# Altium footprint library iuh-thuc-hanh.PcbLib: 72 footprints (part 1 of 5)
Each footprint in its own frame and in the unit in brackets; x right, y up, seen from the top. Pads: shape width x height; smd on the part's side, far side on the other; paste and mask are expansions set on the pad; w line width, h text height; cw(c..) or ccw(c..) is an arc to the next point about the centre after c.
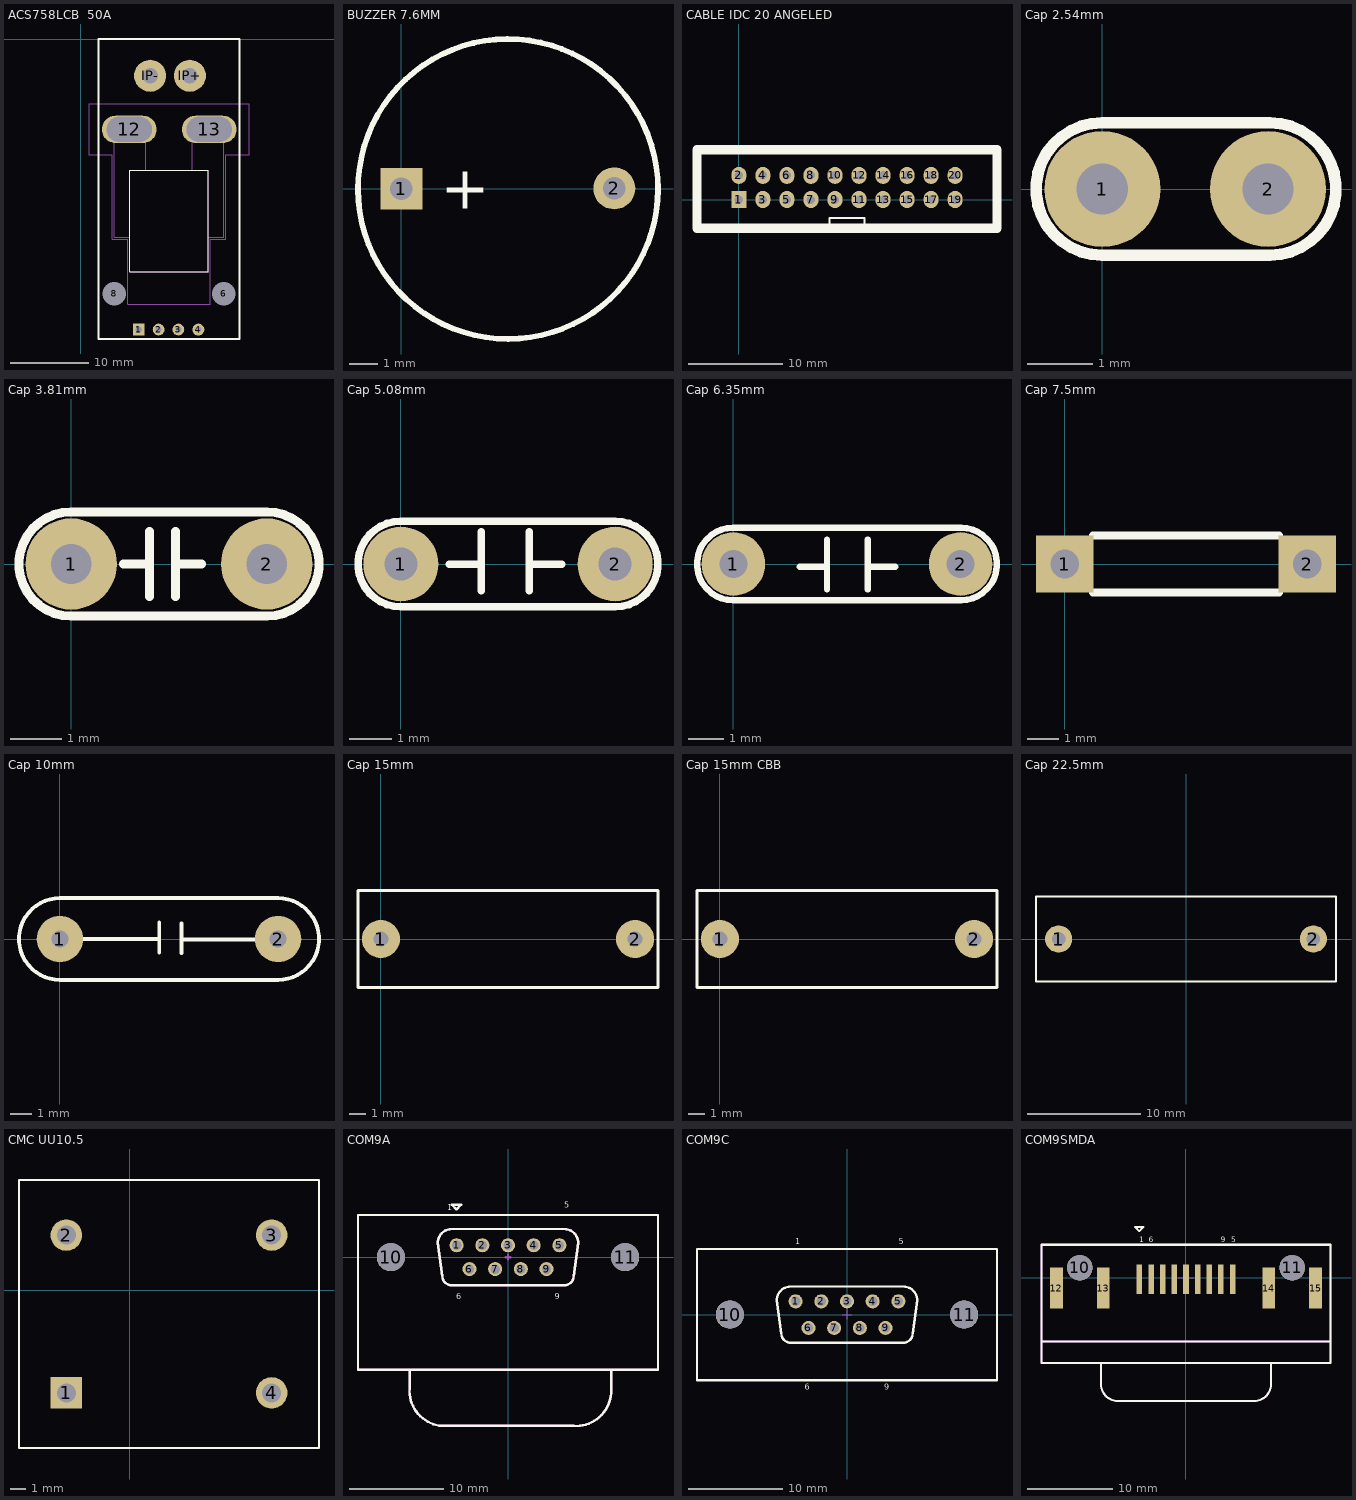
[diagram p0: the footprints below, top view; thin cyan lines are the x and y axes]

## ACS758LCB  50A [mm]
height 7.1
pads (10):
  rect 1.5x1.5 / inner round 1.5 / far side rect 1.5x1.5 hole 0.8: 1(7.434,-37.148)
  round 1.5 hole 0.8: 2(9.974,-37.148) 3(12.506,-37.148)
  round 1.524 hole 0.762: 4(15.054,-37.148)
  round 1.524 hole 3: 6(18.288,-32.575) 8(4.318,-32.575)
  oval 7x3.5 hole 3.2 slot 5.8 at 0 deg unplated: 12(6.223,-11.557) 13(16.447,-11.557)
  round 4.1 hole 2: IP+(13.97,-4.699) IP-(8.89,-4.699)
Top Overlay:
  circle w0.2: c10.219,-36.965 r0.1
  lines w0.127: 6.303,-29.775 16.303,-29.775 16.303,-16.775 6.303,-16.775 6.303,-29.775
  lines w0.254: 2.286,-38.354 2.286,0 20.32,0 20.32,-13.525 20.32,-38.354 2.286,-38.354
Mechanical 1:
  lines w0: 6.303,-10.525 6.353,-10.525 ; 16.303,-10.525 16.353,-10.525 ; 4.303,-12.525 cw(c4.303,-11.525) 4.303,-10.525 8.303,-10.525 cw(c8.303,-11.525) 8.303,-12.525 4.303,-12.525 ; 14.303,-12.525 cw(c14.303,-11.525) 14.303,-10.525 18.303,-10.525 cw(c18.303,-11.525) 18.303,-12.525 14.303,-12.525
Mechanical 13:
  circle w0.2: c10.219,-36.965 r0.1
  lines w0.127: 4.303,-10.775 4.303,-25.375 6.303,-25.375 ; 8.303,-16.725 8.303,-10.775 ; 14.303,-16.725 14.303,-10.775 18.303,-10.775 18.303,-25.375 16.303,-25.375 ; 6.303,-25.375 6.303,-16.775 16.303,-16.775 16.303,-29.775 6.303,-29.775 6.303,-25.375
Mechanical 15:
  lines w0.05: 1.053,-14.775 4.053,-14.775 4.053,-25.625 6.053,-25.625 6.053,-33.925 16.553,-33.925 16.553,-25.625 18.553,-25.625 18.553,-14.775 21.553,-14.775 21.553,-8.275 1.053,-8.275 ; 1.079,-14.755 1.079,-8.255
3D body "step_temp.STEP": height 7.1, standoff -3.5, extent 4.366,-33.361 18.367,-10.775
3D body: height -0.1, standoff -0.2, extent 2.27,-34.037 20.32,-8.234

## BUZZER 7.6MM [mm]
pads (2):
  rect 1.5x1.5 hole 0.8: 1(0,0)
  round 1.5 hole 0.8: 2(7.62,0.013)
Top Overlay:
  lines w0.203: 7.724,3.67 ccw(c3.816,-0.008) 7.76,3.632
  text "+" at 1.41,-0.711 h1.52
3D body "User Library-Buzzer WST-1203UX.step": height 4.5, standoff -9.65, extent -2.215,-6 13.239,6

## CABLE IDC 20 ANGELED [mm] "Connector; Header; 5x2 Position"
pads (20):
  rect 1.6x1.8 hole 0.9: 1(0,0)
  oval 1.6x1.8 hole 0.9: 2(0,2.54) 3(2.54,0) 4(2.54,2.54) 5(5.08,0) 6(5.08,2.54) 7(7.62,0) 8(7.62,2.54) 9(10.16,0) 10(10.16,2.54) 11(12.7,0) 12(12.7,2.54) 13(15.24,0) 14(15.24,2.54) 15(17.78,0) 16(17.78,2.54) 17(20.32,0) 18(20.32,2.54) 19(22.86,0) 20(22.86,2.54)
Top Overlay:
  lines w0.254: 9.576,-2.5 9.576,-1.956 11.43,-1.956 13.284,-1.956 13.284,-2.5
  lines w1: 8.28,-3.048 27.28,-3.048 27.28,5.27 8.28,5.27 ; 14.58,-3.048 -4.42,-3.048 -4.42,5.27 14.58,5.27
3D body "IDC 20P ANGELED MALE.stp": height 10.61, standoff -2.39, extent -5.08,-0.292 27.94,20.853

## Cap 2.54mm [mil]
height 200
pads (2):
  round 70 hole 31: 1(0,0) 2(100,0)
Top Overlay:
  lines w7: 100,-40 0,-40 cw(c0,0) 0,40 100,40 ; 101,-40 ccw(c101,0) 101,40
3D body "SW3dPS-Cap 100n.STEP": height 265, standoff -46.85, extent -59.93,-30 169.93,36.79

## Cap 3.81mm [mil]
height 200
pads (2):
  round 70 hole 31: 1(0,0) 2(150,0)
Top Overlay:
  lines w7: 40,0 60,0 ; 60,-25 60,25 ; 80,-25 80,25 ; 80,0 100,0 ; 0,-40 cw(c0,0) 0,40 150,40 cw(c150,0) 150,-40 0,-40
3D body "User Library-6mm radial ceramic disc capacitor.STEP": height 988.96, standoff -334.65, extent -41.22,-70 195,79.61

## Cap 5.08mm [mil]
height 200
pads (2):
  round 70 hole 31: 1(0,0) 2(200,0)
Top Overlay:
  lines w7: 45,0 75,0 ; 75,-25 75,30 ; 120,-25 120,30 ; 120,0 150,0 ; 0,-40 cw(c0,0) 0,40 200,40 cw(c200,0) 200,-40 0,-40
3D body "SW3DPS-TANT_2M_2M-DEFAULT.STEP": height 422.7, standoff -70, extent -25.5,-125 225.5,125.62

## Cap 6.35mm [mil] "Tu pin to pin 250mil"
height 200
pads (2):
  round 70 hole 31: 1(0,0) 2(250,0)
Top Overlay:
  lines w7: 73,-3 103,-3 ; 103,-28 103,27 ; 148,-28 148,27 ; 148,-3 178,-3 ; 250,-40 ccw(c250,0) 250,40 ; 250.94,-40 0,-40 cw(c0,0) 0,40 250.94,40
3D body "User Library-6mm radial ceramic disc capacitor.STEP": height 988.96, standoff -334.65, extent 6.89,-74.8 243.11,74.8

## Cap 7.5mm [mm] "103 2KV"
pads (2):
  rect 1.8x1.8 hole 0.9: 1(0,0) 2(7.62,0)
Top Overlay:
  lines w0.254: 0.889,-0.889 6.731,-0.889 ; 0.889,0.889 6.731,0.889
3D body "User Library-Panasonic ECK-A3D102KBP.step": height 9.03, standoff -4.16, extent -0.19,-1.198 7.811,1.195

## Cap 10mm [mil] "Cap np W 0.4"
height 200
pads (2):
  round 85 hole 31: 1(0,0) 2(400,0)
Top Overlay:
  lines w7: 44,0 182,0 ; 182,-25 182,30 ; 223,-26 223,29 ; 223,-1 360,-1 ; 399,75 0,75 ccw(c0,0) 0,-75 400,-75 ccw(c400,0) 400,75
3D body "ECQ-E6103KF.stp": height 236.22, standoff -118.11, extent -24.54,-63.98 430.82,63.98

## Cap 15mm [mil]
height 100
pads (2):
  round 90 hole 35: 1(0,0) 2(600,0)
Top Overlay:
  lines w7: -54,-115 -54,115 654,115 654,-115 -54,-115
3D body "SW3dPS-cap_r60_pi3100d0j.STEP": height 731.5, standoff -488.98, extent -54.33,-145.28 654.33,150

## Cap 15mm CBB [mil]
height 100
pads (2):
  round 90 hole 35: 1(0,0) 2(600,0)
Top Overlay:
  lines w7: -54,-115 654,-115 654,115 -54,115 -54,-115
3D body "freecad_film_capacitor.step": height 629.92, standoff -196.85, extent -54.33,-155 654.33,159.96

## Cap 22.5mm [mm]
height 2.54
pads (2):
  round 2.4 hole 1.2: 1(-11.25,0) 2(11.25,0)
Top Overlay:
  lines w0.178: -13.25,-3.75 -13.25,3.75 13.25,3.75 13.25,-3.75 -13.25,-3.75
3D body "FILM_RED_P2250L2650W700H1650PD80.step": height 16.5, standoff -6.2, extent -13.25,-3.5 13.25,3.5

## CMC UU10.5 [mm]
pads (4):
  rect 2x2 hole 1.2: 1(-4,-6.5)
  round 2 hole 1.2: 2(-4,3.5) 3(9,3.5) 4(9,-6.5)
Top Overlay:
  lines w0.127: -7,-10 12,-10 12,7 -7,7 -7,-10
3D body "User Library-Choke 13x10.STEP": height 28.08, standoff -2.7, extent -8.411,-11.049 13.745,7.951

## COM9A [mm] "D-SUB- 9P, MALE, RT ANGLE, TH"
height 12
pads (11):
  round 1.5 hole 1 unplated: 1(-5.48,1.27) 2(-2.74,1.27) 3(0,1.27) 4(2.74,1.27) 5(5.48,1.27) 6(-4.11,-1.27) 7(-1.37,-1.27) 8(1.37,-1.27) 9(4.11,-1.27)
  round 3 hole 3 unplated: 10(-12.5,0) 11(12.5,0)
Top Overlay:
  lines w0.254: -10.5,-12 -10.5,-14 ccw(c-6.75,-14.25) -7,-18 7,-18 ccw(c7.25,-14.25) 11,-14.5 11,-12 ; -5.996,-3.004 cw(c-5.996,-2) -7,-2 -7.5,1.5 cw(c-6,1.5) -6,3 6,3 cw(c6,1.5) 7.5,1.5 7,-2 cw(c5.996,-2) 5.996,-3.004 ; -5.996,-3 6,-3 ; -5.5,5.1 -5,5.6 -6,5.6 -5.5,5.1 ; -5.5,5.1 -5.5,5.1 ; -16,-12 16,-12 16,4.5 -16,4.5 -16,0 -16,-12
  text "1" at -6.5,5 h0.64
  text "5" at 6,5.25 h0.64
  text "9" at 5,-4.5 h0.64
  text "6" at -5.5,-4.5 h0.64
Mechanical 15:
  lines w0.254: -10.5,-12 -10.5,-14 ccw(c-6.75,-14.25) -7,-18 7,-18 ccw(c7.25,-14.25) 11,-14.5 11,-12 ; -5.996,-3.004 cw(c-5.996,-2) -7,-2 -7.5,1.5 cw(c-6,1.5) -6,3 6,3 cw(c6,1.5) 7.5,1.5 7,-2 cw(c5.996,-2) 5.996,-3.004 ; -5.996,-3 6,-3 ; -0.25,0 0.25,0 ; 0,-0.25 0,0.25 ; -16,-12 -16,0 -16,4.5 16,4.5 16,-12 -16,-12
3D body "210112043.stp": height 13.2, standoff -3.6, extent -15.4,-17.5 15.4,4.2

## COM9C [mm] "D-SUB- 9P, MALE, SOLDER BUCKET VERTICAL MOUNT, TH"
height 12
pads (11):
  round 1.5 hole 1 unplated: 1(-5.48,1.42) 2(-2.74,1.42) 3(0,1.42) 4(2.74,1.42) 5(5.48,1.42) 6(-4.11,-1.42) 7(-1.37,-1.42) 8(1.37,-1.42) 9(4.11,-1.42)
  round 3 hole 3 unplated: 10(-12.5,0) 11(12.5,0)
Top Overlay:
  lines w0.254: -5.996,-3.004 cw(c-5.996,-2) -7,-2 -7.5,1.5 cw(c-6,1.5) -6,3 6,3 cw(c6,1.5) 7.5,1.5 7,-2 cw(c5.996,-2) 5.996,-3.004 ; -5.996,-3 6,-3 ; -16,-7 16,-7 16,7 -16,7 -16,0 -16,-7
  text "5" at 5.5,7.5 h0.64
  text "1" at -5.5,7.5 h0.64
  text "9" at 4,-8 h0.64
  text "6" at -4.5,-8 h0.64
Mechanical 15:
  lines w0.102: -0.5,0 0.5,0 ; 0,-0.5 0,0.5
3D body "210113003.stp": height 12.5, standoff -4.8, extent -15.4,-6.2 15.4,6.2

## COM9SMDA [mm] "D-SUB- 9P, MALE, RT ANGLE, SMT"
height 12.4
pads (15):
  rect 0.65x3.5 smd: 1(-5.48,-0.15) 2(-2.74,-0.15) 3(0,-0.15) 4(2.74,-0.15) 5(5.48,-0.15) 6(-4.11,-0.15) 7(-1.37,-0.15) 8(1.37,-0.15) 9(4.11,-0.15)
  round 3 hole 3 unplated: 10(-12.5,1.2) 11(12.5,1.2)
  rect 1.5x4.8 smd: 12(-15.25,-1.2) 13(-9.75,-1.2) 14(9.75,-1.2) 15(15.25,-1.2)
Top Overlay:
  lines w0.254: -10,-10 -10,-12.5 ccw(c-8,-12.5) -8,-14.5 8,-14.5 ccw(c8,-12.5) 10,-12.5 10,-10 ; -17,-7.5 -17,-10 17,-10 17,-7.5 ; -17,-7.5 -17,3.9 17,3.9 17,-7.5 ; -17,-7.5 17,-7.5 ; -6,6 -5.5,6 -5,6 -5.5,5.5 -6,6
  text "1" at -5.5,4.2 h0.64
  text "5" at 5.3,4.2 h0.64
  text "9" at 4.1,4.2 h0.64
  text "6" at -4.4,4.2 h0.64
Mechanical 15:
  lines w0.102: -0.9,0 0.9,0 ; 0,-0.9 0,0.9
  lines w0.254: -10,-10 -10,-12.5 ccw(c-8,-12.5) -8,-14.5 8,-14.5 ccw(c8,-12.5) 10,-12.5 10,-10 ; -17,-7.5 -17,-10 17,-10 17,-7.5 ; -17,-7.5 -17,3.9 17,3.9 17,-7.5 ; -17,-7.5 17,-7.5
3D body "240117113.stp": height 12.7, standoff -2.8, extent -15.5,-14.3 15.5,4